# Altium footprint library Connectors.PcbLib: 120 footprints (part 2 of 8)
Each footprint in its own frame and in the unit in brackets; x right, y up, seen from the top. Pads: shape width x height; smd on the part's side, far side on the other; paste and mask are expansions set on the pad; w line width, h text height; cw(c..) or ccw(c..) is an arc to the next point about the centre after c.
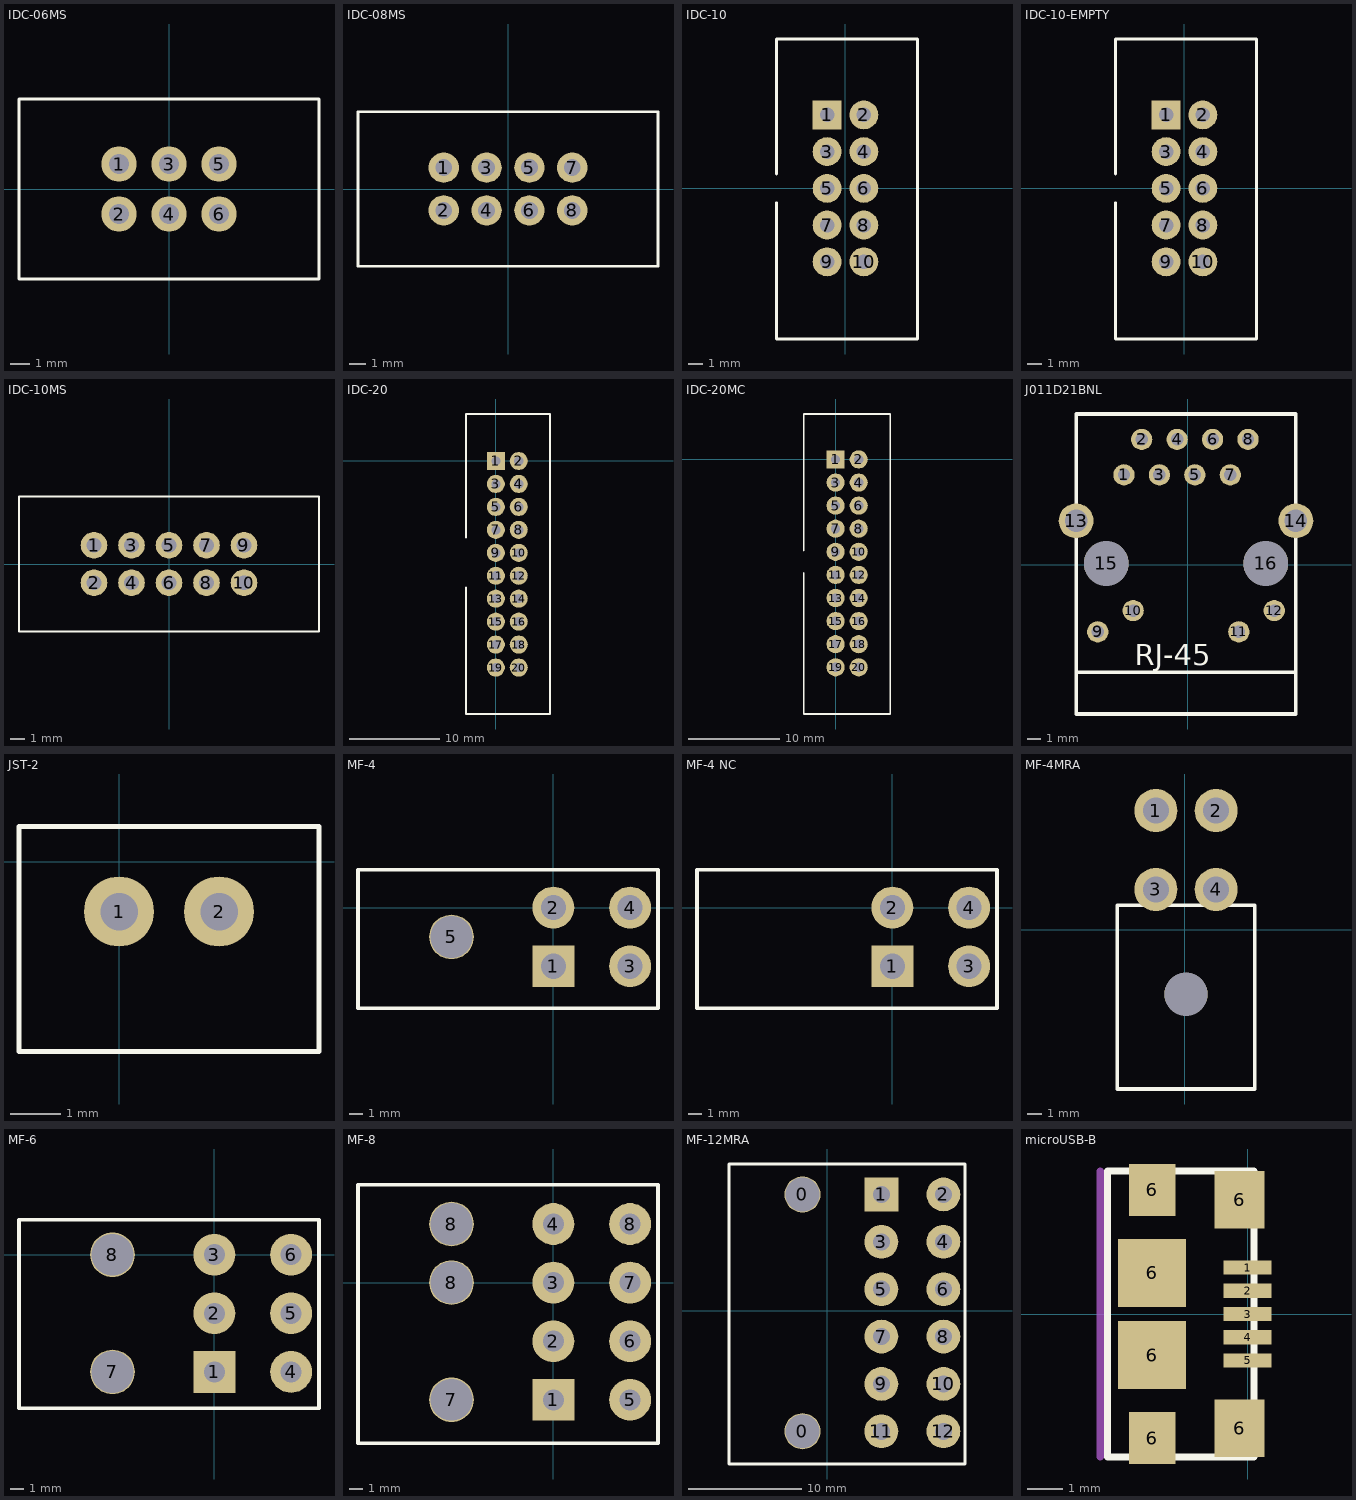
[diagram p1: the footprints below, top view; thin cyan lines are the x and y axes]

## IDC-06MS [mm]
pads (6):
  round 1.8 hole 1: 1(-2.54,1.27) 2(-2.54,-1.27) 3(0,1.27) 4(0,-1.27) 5(2.54,1.27) 6(2.54,-1.27)
Top Overlay:
  lines w0.15: -7.62,-4.572 7.62,-4.572 7.62,4.572 -7.62,4.572 -7.62,-4.572

## IDC-08MS [mm]
pads (8):
  round 1.8 hole 1: 1(-3.81,1.27) 2(-3.81,-1.27) 3(-1.27,1.27) 4(-1.27,-1.27) 5(1.27,1.27) 6(1.27,-1.27) 7(3.81,1.27) 8(3.81,-1.27)
Top Overlay:
  lines w0.15: -8.89,-4.572 8.89,-4.572 8.89,4.572 -8.89,4.572 -8.89,-4.572

## IDC-10 [mm] "IDC-10 Male Connector"
height 9
pads (10):
  rect 2x2 hole 1: 1(-1.25,5.075)
  round 2 hole 1: 2(1.29,5.075) 3(-1.25,2.535) 4(1.29,2.535) 5(-1.25,-0.005) 6(1.29,-0.005) 7(-1.25,-2.545) 8(1.29,-2.545) 9(-1.25,-5.085) 10(1.29,-5.085)
Top Overlay:
  lines w0.2: -4.75,-1 -4.75,-10.425 5,-10.425 5,10.325 -4.75,10.325 -4.75,1
3D body "User Library-BH-10__64BH-10.STEP": height 9.1, standoff -3, extent -4.53,-10.305 4.77,10.195

## IDC-10-EMPTY [mm] "IDC-10 Male Connector"
height 9
pads (10):
  rect 2x2 hole 1: 1(-1.25,5.075)
  round 2 hole 1: 2(1.29,5.075) 3(-1.25,2.535) 4(1.29,2.535) 5(-1.25,-0.005) 6(1.29,-0.005) 7(-1.25,-2.545) 8(1.29,-2.545) 9(-1.25,-5.085) 10(1.29,-5.085)
Top Overlay:
  lines w0.2: -4.75,-1 -4.75,-10.425 5,-10.425 5,10.325 -4.75,10.325 -4.75,1

## IDC-10MS [mm]
pads (10):
  round 1.8 hole 1: 1(-5.08,1.27) 2(-5.08,-1.27) 3(-2.54,1.27) 4(-2.54,-1.27) 5(0,1.27) 6(0,-1.27) 7(2.54,1.27) 8(2.54,-1.27) 9(5.08,1.27) 10(5.08,-1.27)
Top Overlay:
  lines w0.15: -10.16,-4.572 10.16,-4.572 10.16,4.572 -10.16,4.572 -10.16,-4.572
3D body "User Library-BH-10__64BH-10.STEP": height 9.1, standoff -3, extent -10.25,-4.75 10.25,4.55

## IDC-20 [mm] "IDC-20 Male Connector"
height 9
pads (20):
  rect 2x2 hole 1: 1(0,0)
  round 2 hole 1: 2(2.54,0) 3(0,-2.54) 4(2.54,-2.54) 5(0,-5.08) 6(2.54,-5.08) 7(0,-7.62) 8(2.54,-7.62) 9(0,-10.16) 10(2.54,-10.16) 11(0,-12.7) 12(2.54,-12.7) 13(0,-15.24) 14(2.54,-15.24) 15(0,-17.78) 16(2.54,-17.78) 17(0,-20.32) 18(2.54,-20.32) 19(0,-22.86) 20(2.54,-22.86)
Top Overlay:
  lines w0.2: -3.3,-14 -3.3,-28 6,-28 6,5.2 -3.3,5.2 -3.3,-8.5
3D body "User Library-BH-10__64BH-20.STEP": height 9.1, standoff -3, extent -3.3,-28 6,5.2

## IDC-20MC [mm] "IDC-20 Male Connector"
height 9
pads (20):
  rect 2x2 hole 1: 1(0,0)
  round 2 hole 1: 2(2.54,0) 3(0,-2.54) 4(2.54,-2.54) 5(0,-5.08) 6(2.54,-5.08) 7(0,-7.62) 8(2.54,-7.62) 9(0,-10.16) 10(2.54,-10.16) 11(0,-12.7) 12(2.54,-12.7) 13(0,-15.24) 14(2.54,-15.24) 15(0,-17.78) 16(2.54,-17.78) 17(0,-20.32) 18(2.54,-20.32) 19(0,-22.86) 20(2.54,-22.86)
Top Overlay:
  lines w0.2: -3.5,-12.5 -3.5,-28 6,-28 6,5 -3.5,5 -3.5,-10
3D body "User Library-BH-10__64BH-20.STEP": height 9.1, standoff -3, extent -3.28,-28.03 6.02,5.17

## J011D21BNL [mm] "RJ45 Jack with Transformers and Lights"
height 14
pads (16):
  round 1.524 hole 0.89: 1(-4.57,6.44) 2(-3.3,8.98) 3(-2.03,6.44) 4(-0.76,8.98) 5(0.51,6.44) 6(1.78,8.98) 7(3.05,6.44) 8(4.32,8.98) 9(-6.45,-4.81) 10(-3.91,-3.29) 11(3.66,-4.81) 12(6.2,-3.29)
  round 2.5 hole 1.6: 13(-8,3.14) 14(7.75,3.14)
  round 3.2 hole 3.2 unplated: 15(-5.84,0.09) 16(5.59,0.09)
Top Overlay:
  lines w0.254: -8,-10.2 -8,-10.7 ; -8,-7.7 7.75,-7.7 ; -8,-10.7 7.75,-10.7 7.75,10.8 -8,10.8 -8,-10.7
  text "RJ-45" at -3.8,-7.2 h1.52
3D body "User Library-SS-60000-009.step": height 13.37, standoff -3.17, extent -8.118,-10.668 7.868,10.38

## JST-2 [mm]
pads (2):
  round 1.4 hole 0.75: 1(0,-1) 2(2,-1)
Top Overlay:
  lines w0.1: -2,-3.8 -2,0.7 4,0.7 4,-3.8 -2,-3.8
3D body "User Library-PCB HEADER (JST BxB-PH-K-S (VERTICAL)).step": height 6, standoff -1.91, extent -2,-3.8 4,0.7

## MF-4 [mm] "MOLEX MiniFit 4 Male Connector"
height 10
pads (5):
  rect 3x3 hole 1.8: 1(0,-4.2)
  round 3 hole 1.8: 2(0,0) 3(5.5,-4.2) 4(5.5,0)
  round 3.2 hole 3 unplated: 5(-7.3,-2.1)
Top Overlay:
  lines w0.254: -14,-7.2 7.5,-7.2 7.5,2.7 -14,2.7 -14,-7.2
3D body "MF-4MRA.stp": height 11.4, standoff -3.6, extent -13.9,-7.275 6.035,2.725

## MF-4 NC [mm] "MOLEX MiniFit 4 (no catch)"
height 10
pads (4):
  rect 3x3 hole 1.8: 1(0,-4.2)
  round 3 hole 1.8: 2(0,0) 3(5.5,-4.2) 4(5.5,0)
Top Overlay:
  lines w0.254: -14,-7.2 7.5,-7.2 7.5,2.7 -14,2.7 -14,-7.2
3D body "MF-4MRA.stp": height 11.4, standoff -3.6, extent -13.9,-7.275 6.035,2.725

## MF-4MRA [mm]
pads (5):
  round 3 hole 1.8: 1(-2,8.3) 2(2.2,8.3) 3(-2,2.8) 4(2.2,2.8)
  round 3 hole 3: ""(0.1,-4.5)
Top Overlay:
  lines w0.254: -4.7,-11.1 -4.7,1.7 4.9,1.7 4.9,-11.1 -4.7,-11.1
3D body "MF-4MRA.stp": height 11.4, standoff -3.6, extent -4.725,-11.1 5.275,8.835

## MF-6 [mm] "MOLEX MiniFit 6 Male Connector"
height 10
pads (8):
  rect 3x3 hole 1.5: 1(0,-8.4)
  round 3 hole 1.5: 2(0,-4.2) 3(0,0) 4(5.5,-8.4) 5(5.5,-4.2) 6(5.5,0)
  round 3.2 hole 3 unplated: 7(-7.3,-8.4) 8(-7.3,0)
Top Overlay:
  lines w0.254: 7.5,-11 7.5,-11 ; 7.5,-11 7.5,2.5 -14,2.5 -14,-11 7.5,-11
3D body "MF-6MRA.stp": height 11.4, standoff -3.6, extent -13.9,-11.5 6.035,2.7

## MF-8 [mm] "MOLEX MiniFit 8 Male Connector"
height 10
pads (11):
  rect 3x3 hole 1.5: 1(0,-8.4)
  round 3 hole 1.5: 2(0,-4.2) 3(0,0) 4(0,4.2) 5(5.5,-8.4) 6(5.5,-4.2) 7(5.5,0) 8(5.5,4.2)
  round 3.2 hole 3 unplated: 7(-7.3,-8.4) 8(-7.3,0) 8(-7.3,4.2)
Top Overlay:
  lines w0.254: -14,-11.5 7.5,-11.5 7.5,7 -14,7 -14,-11.5
3D body "4750.step": height 11.4, standoff -3.6, extent -13.935,-11.45 6,6.95

## MF-12MRA [mm]
pads (14):
  round 3.2 hole 3 unplated: 0(-2.2,-10.7) 0(-2.2,10.3)
  rect 3x3 hole 1.5: 1(4.8,10.3)
  round 3 hole 1.5: 2(10.3,10.3) 3(4.8,6.1) 4(10.3,6.1) 5(4.8,1.9) 6(10.3,1.9) 7(4.8,-2.3) 8(10.3,-2.3) 9(4.8,-6.5) 10(10.3,-6.5) 11(4.8,-10.7) 12(10.3,-10.7)
Top Overlay:
  lines w0.254: -8.7,-13.6 -8.7,13 12.2,13 12.2,-13.6 -8.7,-13.6 ; -8.7,-13.6 -8.7,-13.6

## microUSB-B [mm]
pads (11):
  rect 1.35x0.4 smd paste+0: 1(0,1.3) 2(0,0.65) 3(0,0) 4(0,-0.65) 5(0,-1.3)
  rect 1.9x1.9 smd paste+0: 6(-2.675,-1.15)
  rect 1.9x1.9 smd: 6(-2.675,1.15)
  rect 1.3x1.45 smd paste+0: 6(-2.675,3.475) 6(-2.675,-3.475)
  rect 1.4x1.6 smd paste+0: 6(-0.225,-3.2) 6(-0.225,3.2)
Top Overlay:
  lines w0.2: -3.925,-4 0.175,-4 0.175,4 -3.925,4 -3.925,-4
Mechanical 1:
  lines w0.2: -4.125,-4 -4.125,4
3D body "c-1981568-1-g-3d.stp": height 2.74, standoff -0.34, extent -5.425,-4 0.175,4